# Altium integrated library WE_WR-TBL_Pluggable System_3.81 mm_rev15b.IntLib: 215 symbols (part 1 of 2) (continued)
## 691321300021
designator J?
WR-TBL Terminal block - serie 3213- 3.81 mm; Manufacturer: Würth Elektronik eiSos GmbH; ComponentLink1 Description: Manufacturer; ComponentLink2 Description: Datasheet; NoPins: 21; Created Date: 11 December 2013; partNo: 691321300021; ComponentLink1URL: http://www.we-online.com; ComponentLink2URL: http://katalog.we-online.de/em/datasheet/6913213000xx.pdf; Created by: Karrer Zheng
footprint 691321300021 (3,81mm - PCB Headers - Vertical - 21p)
pins: 1, 2, 3, 4, 5, 6, 7, 8, 9, 10, 11, 12, 13, 14, 15, 16, 17, 18, 19, 20, 21

## 691321300022
designator J?
WR-TBL Terminal block - serie 3213- 3.81 mm; Manufacturer: Würth Elektronik eiSos GmbH; ComponentLink1 Description: Manufacturer; ComponentLink2 Description: Datasheet; NoPins: 22; Created Date: 11 December 2013; partNo: 691321300022; ComponentLink1URL: http://www.we-online.com; ComponentLink2URL: http://katalog.we-online.de/em/datasheet/6913213000xx.pdf; Created by: Karrer Zheng
footprint 691321300022 (3,81mm - PCB Headers - Vertical - 22p)
pins: 1, 2, 3, 4, 5, 6, 7, 8, 9, 10, 11, 12, 13, 14, 15, 16, 17, 18, 19, 20, 21, 22

## 691321300023
designator J?
WR-TBL Terminal block - serie 3213- 3.81 mm; Manufacturer: Würth Elektronik eiSos GmbH; ComponentLink1 Description: Manufacturer; ComponentLink2 Description: Datasheet; NoPins: 23; Created Date: 11 December 2013; partNo: 691321300023; ComponentLink1URL: http://www.we-online.com; ComponentLink2URL: http://katalog.we-online.de/em/datasheet/6913213000xx.pdf; Created by: Karrer Zheng
footprint 691321300023 (3,81mm - PCB Headers - Vertical - 23p)
pins: 1, 2, 3, 4, 5, 6, 7, 8, 9, 10, 11, 12, 13, 14, 15, 16, 17, 18, 19, 20, 21, 22, 23

## 691321300024
designator J?
WR-TBL Terminal block - serie 3213- 3.81 mm; Manufacturer: Würth Elektronik eiSos GmbH; ComponentLink1 Description: Manufacturer; ComponentLink2 Description: Datasheet; NoPins: 24; Created Date: 11 December 2013; partNo: 691321300024; ComponentLink1URL: http://www.we-online.com; ComponentLink2URL: http://katalog.we-online.de/em/datasheet/6913213000xx.pdf; Created by: Karrer Zheng
footprint 691321300024 (3,81mm - PCB Headers - Vertical - 24p)
pins: 1, 2, 3, 4, 5, 6, 7, 8, 9, 10, 11, 12, 13, 14, 15, 16, 17, 18, 19, 20, 21, 22, 23, 24


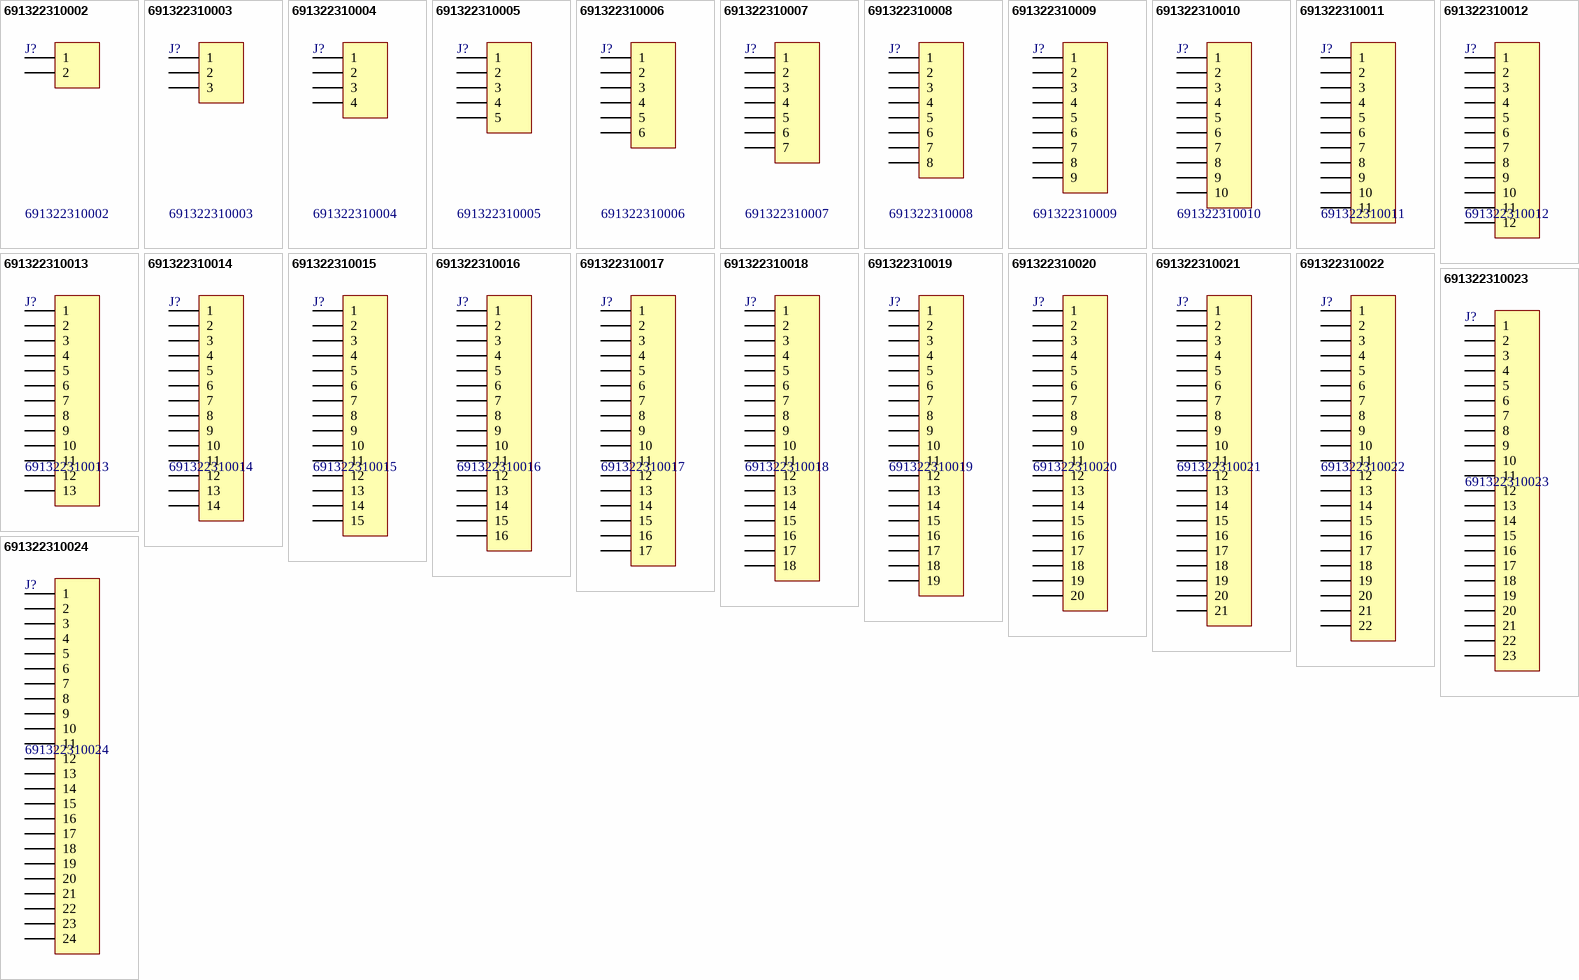
[diagram p5: symbols 691322310002 to 691322310024]

## 691322310002
designator J?
WR-TBL Terminal block - serie 322 - 3.81 mm; Manufacturer: Würth Elektronik eiSos GmbH; ComponentLink1 Description: Manufacturer; ComponentLink2 Description: Datasheet; NoPins: 02; Created Date: 25 December 2013; partNo: 691322310002; ComponentLink1URL: http://www.we-online.com; ComponentLink2URL: http://katalog.we-online.de/em/datasheet/6913223100xx.pdf; Created by: Karrer Zheng
footprint 691322310002 (3,81mm - PCB Headers - Horizontal - 02p)
pins: 1, 2

## 691322310003
designator J?
WR-TBL Terminal block - serie 322 - 3.81 mm; Manufacturer: Würth Elektronik eiSos GmbH; ComponentLink1 Description: Manufacturer; ComponentLink2 Description: Datasheet; NoPins: 03; Created Date: 25 December 2013; partNo: 691322310003; ComponentLink1URL: http://www.we-online.com; ComponentLink2URL: http://katalog.we-online.de/em/datasheet/6913223100xx.pdf; Created by: Karrer Zheng
footprint 691322310003 (3,81mm - PCB Headers - Horizontal - 03p)
pins: 1, 2, 3

## 691322310004
designator J?
WR-TBL Terminal block - serie 322 - 3.81 mm; Manufacturer: Würth Elektronik eiSos GmbH; ComponentLink1 Description: Manufacturer; ComponentLink2 Description: Datasheet; NoPins: 04; Created Date: 25 December 2013; partNo: 691322310004; ComponentLink1URL: http://www.we-online.com; ComponentLink2URL: http://katalog.we-online.de/em/datasheet/6913223100xx.pdf; Created by: Karrer Zheng
footprint 691322310004 (3,81mm - PCB Headers - Horizontal - 04p)
pins: 1, 2, 3, 4

## 691322310005
designator J?
WR-TBL Terminal block - serie 322 - 3.81 mm; Manufacturer: Würth Elektronik eiSos GmbH; ComponentLink1 Description: Manufacturer; ComponentLink2 Description: Datasheet; NoPins: 05; Created Date: 25 December 2013; partNo: 691322310005; ComponentLink1URL: http://www.we-online.com; ComponentLink2URL: http://katalog.we-online.de/em/datasheet/6913223100xx.pdf; Created by: Karrer Zheng
footprint 691322310005 (3,81mm - PCB Headers - Horizontal - 05p)
pins: 1, 2, 3, 4, 5

## 691322310006
designator J?
WR-TBL Terminal block - serie 322 - 3.81 mm; Manufacturer: Würth Elektronik eiSos GmbH; ComponentLink1 Description: Manufacturer; ComponentLink2 Description: Datasheet; NoPins: 06; Created Date: 25 December 2013; partNo: 691322310006; ComponentLink1URL: http://www.we-online.com; ComponentLink2URL: http://katalog.we-online.de/em/datasheet/6913223100xx.pdf; Created by: Karrer Zheng
footprint 691322310006 (3,81mm - PCB Headers - Horizontal - 06p)
pins: 1, 2, 3, 4, 5, 6

## 691322310007
designator J?
WR-TBL Terminal block - serie 322 - 3.81 mm; Manufacturer: Würth Elektronik eiSos GmbH; ComponentLink1 Description: Manufacturer; ComponentLink2 Description: Datasheet; NoPins: 07; Created Date: 25 December 2013; partNo: 691322310007; ComponentLink1URL: http://www.we-online.com; ComponentLink2URL: http://katalog.we-online.de/em/datasheet/6913223100xx.pdf; Created by: Karrer Zheng
footprint 691322310007 (3,81mm - PCB Headers - Horizontal - 07p)
pins: 1, 2, 3, 4, 5, 6, 7

## 691322310008
designator J?
WR-TBL Terminal block - serie 322 - 3.81 mm; Manufacturer: Würth Elektronik eiSos GmbH; ComponentLink1 Description: Manufacturer; ComponentLink2 Description: Datasheet; NoPins: 08; Created Date: 25 December 2013; partNo: 691322310008; ComponentLink1URL: http://www.we-online.com; ComponentLink2URL: http://katalog.we-online.de/em/datasheet/6913223100xx.pdf; Created by: Karrer Zheng
footprint 691322310008 (3,81mm - PCB Headers - Horizontal - 08p)
pins: 1, 2, 3, 4, 5, 6, 7, 8

## 691322310009
designator J?
WR-TBL Terminal block - serie 322 - 3.81 mm; Manufacturer: Würth Elektronik eiSos GmbH; ComponentLink1 Description: Manufacturer; ComponentLink2 Description: Datasheet; NoPins: 09; Created Date: 25 December 2013; partNo: 691322310009; ComponentLink1URL: http://www.we-online.com; ComponentLink2URL: http://katalog.we-online.de/em/datasheet/6913223100xx.pdf; Created by: Karrer Zheng
footprint 691322310009 (3,81mm - PCB Headers - Horizontal - 09p)
pins: 1, 2, 3, 4, 5, 6, 7, 8, 9

## 691322310010
designator J?
WR-TBL Terminal block - serie 322 - 3.81 mm; Manufacturer: Würth Elektronik eiSos GmbH; ComponentLink1 Description: Manufacturer; ComponentLink2 Description: Datasheet; NoPins: 10; Created Date: 25 December 2013; partNo: 691322310010; ComponentLink1URL: http://www.we-online.com; ComponentLink2URL: http://katalog.we-online.de/em/datasheet/6913223100xx.pdf; Created by: Karrer Zheng
footprint 691322310010 (3,81mm - PCB Headers - Horizontal - 10p)
pins: 1, 2, 3, 4, 5, 6, 7, 8, 9, 10

## 691322310011
designator J?
WR-TBL Terminal block - serie 322 - 3.81 mm; Manufacturer: Würth Elektronik eiSos GmbH; ComponentLink1 Description: Manufacturer; ComponentLink2 Description: Datasheet; NoPins: 11; Created Date: 25 December 2013; partNo: 691322310011; ComponentLink1URL: http://www.we-online.com; ComponentLink2URL: http://katalog.we-online.de/em/datasheet/6913223100xx.pdf; Created by: Karrer Zheng
footprint 691322310011 (3,81mm - PCB Headers - Horizontal - 11p)
pins: 1, 2, 3, 4, 5, 6, 7, 8, 9, 10, 11

## 691322310012
designator J?
WR-TBL Terminal block - serie 322 - 3.81 mm; Manufacturer: Würth Elektronik eiSos GmbH; ComponentLink1 Description: Manufacturer; ComponentLink2 Description: Datasheet; NoPins: 12; Created Date: 25 December 2013; partNo: 691322310012; ComponentLink1URL: http://www.we-online.com; ComponentLink2URL: http://katalog.we-online.de/em/datasheet/6913223100xx.pdf; Created by: Karrer Zheng
footprint 691322310012 (3,81mm - PCB Headers - Horizontal - 12p)
pins: 1, 2, 3, 4, 5, 6, 7, 8, 9, 10, 11, 12

## 691322310013
designator J?
WR-TBL Terminal block - serie 322 - 3.81 mm; Manufacturer: Würth Elektronik eiSos GmbH; ComponentLink1 Description: Manufacturer; ComponentLink2 Description: Datasheet; NoPins: 13; Created Date: 25 December 2013; partNo: 691322310013; ComponentLink1URL: http://www.we-online.com; ComponentLink2URL: http://katalog.we-online.de/em/datasheet/6913223100xx.pdf; Created by: Karrer Zheng
footprint 691322310013 (3,81mm - PCB Headers - Horizontal - 13p)
pins: 1, 2, 3, 4, 5, 6, 7, 8, 9, 10, 11, 12, 13

## 691322310014
designator J?
WR-TBL Terminal block - serie 322 - 3.81 mm; Manufacturer: Würth Elektronik eiSos GmbH; ComponentLink1 Description: Manufacturer; ComponentLink2 Description: Datasheet; NoPins: 14; Created Date: 25 December 2013; partNo: 691322310014; ComponentLink1URL: http://www.we-online.com; ComponentLink2URL: http://katalog.we-online.de/em/datasheet/6913223100xx.pdf; Created by: Karrer Zheng
footprint 691322310014 (3,81mm - PCB Headers - Horizontal - 14p)
pins: 1, 2, 3, 4, 5, 6, 7, 8, 9, 10, 11, 12, 13, 14

## 691322310015
designator J?
WR-TBL Terminal block - serie 322 - 3.81 mm; Manufacturer: Würth Elektronik eiSos GmbH; ComponentLink1 Description: Manufacturer; ComponentLink2 Description: Datasheet; NoPins: 15; Created Date: 25 December 2013; partNo: 691322310015; ComponentLink1URL: http://www.we-online.com; ComponentLink2URL: http://katalog.we-online.de/em/datasheet/6913223100xx.pdf; Created by: Karrer Zheng
footprint 691322310015 (3,81mm - PCB Headers - Horizontal - 15p)
pins: 1, 2, 3, 4, 5, 6, 7, 8, 9, 10, 11, 12, 13, 14, 15

## 691322310016
designator J?
WR-TBL Terminal block - serie 322 - 3.81 mm; Manufacturer: Würth Elektronik eiSos GmbH; ComponentLink1 Description: Manufacturer; ComponentLink2 Description: Datasheet; NoPins: 16; Created Date: 25 December 2013; partNo: 691322310016; ComponentLink1URL: http://www.we-online.com; ComponentLink2URL: http://katalog.we-online.de/em/datasheet/6913223100xx.pdf; Created by: Karrer Zheng
footprint 691322310016 (3,81mm - PCB Headers - Horizontal - 16p)
pins: 1, 2, 3, 4, 5, 6, 7, 8, 9, 10, 11, 12, 13, 14, 15, 16

## 691322310017
designator J?
WR-TBL Terminal block - serie 322 - 3.81 mm; Manufacturer: Würth Elektronik eiSos GmbH; ComponentLink1 Description: Manufacturer; ComponentLink2 Description: Datasheet; NoPins: 17; Created Date: 25 December 2013; partNo: 691322310017; ComponentLink1URL: http://www.we-online.com; ComponentLink2URL: http://katalog.we-online.de/em/datasheet/6913223100xx.pdf; Created by: Karrer Zheng
footprint 691322310017 (3,81mm - PCB Headers - Horizontal - 17p)
pins: 1, 2, 3, 4, 5, 6, 7, 8, 9, 10, 11, 12, 13, 14, 15, 16, 17

## 691322310018
designator J?
WR-TBL Terminal block - serie 322 - 3.81 mm; Manufacturer: Würth Elektronik eiSos GmbH; ComponentLink1 Description: Manufacturer; ComponentLink2 Description: Datasheet; NoPins: 18; Created Date: 25 December 2013; partNo: 691322310018; ComponentLink1URL: http://www.we-online.com; ComponentLink2URL: http://katalog.we-online.de/em/datasheet/6913223100xx.pdf; Created by: Karrer Zheng
footprint 691322310018 (3,81mm - PCB Headers - Horizontal -18p)
pins: 1, 2, 3, 4, 5, 6, 7, 8, 9, 10, 11, 12, 13, 14, 15, 16, 17, 18

## 691322310019
designator J?
WR-TBL Terminal block - serie 322 - 3.81 mm; Manufacturer: Würth Elektronik eiSos GmbH; ComponentLink1 Description: Manufacturer; ComponentLink2 Description: Datasheet; NoPins: 19; Created Date: 25 December 2013; partNo: 691322310019; ComponentLink1URL: http://www.we-online.com; ComponentLink2URL: http://katalog.we-online.de/em/datasheet/6913223100xx.pdf; Created by: Karrer Zheng
footprint 691322310019 (3,81mm - PCB Headers - Horizontal - 19p)
pins: 1, 2, 3, 4, 5, 6, 7, 8, 9, 10, 11, 12, 13, 14, 15, 16, 17, 18, 19

## 691322310020
designator J?
WR-TBL Terminal block - serie 322 - 3.81 mm; Manufacturer: Würth Elektronik eiSos GmbH; ComponentLink1 Description: Manufacturer; ComponentLink2 Description: Datasheet; NoPins: 20; Created Date: 25 December 2013; partNo: 691322310020; ComponentLink1URL: http://www.we-online.com; ComponentLink2URL: http://katalog.we-online.de/em/datasheet/6913223100xx.pdf; Created by: Karrer Zheng
footprint 691322310020 (3,81mm - PCB Headers - Horizontal - 20p)
pins: 1, 2, 3, 4, 5, 6, 7, 8, 9, 10, 11, 12, 13, 14, 15, 16, 17, 18, 19, 20

## 691322310021
designator J?
WR-TBL Terminal block - serie 322 - 3.81 mm; Manufacturer: Würth Elektronik eiSos GmbH; ComponentLink1 Description: Manufacturer; ComponentLink2 Description: Datasheet; NoPins: 21; Created Date: 25 December 2013; partNo: 691322310021; ComponentLink1URL: http://www.we-online.com; ComponentLink2URL: http://katalog.we-online.de/em/datasheet/6913223100xx.pdf; Created by: Karrer Zheng
footprint 691322310021 (3,81mm - PCB Headers - Horizontal - 21p)
pins: 1, 2, 3, 4, 5, 6, 7, 8, 9, 10, 11, 12, 13, 14, 15, 16, 17, 18, 19, 20, 21

## 691322310022
designator J?
WR-TBL Terminal block - serie 322 - 3.81 mm; Manufacturer: Würth Elektronik eiSos GmbH; ComponentLink1 Description: Manufacturer; ComponentLink2 Description: Datasheet; NoPins: 22; Created Date: 25 December 2013; partNo: 691322310022; ComponentLink1URL: http://www.we-online.com; ComponentLink2URL: http://katalog.we-online.de/em/datasheet/6913223100xx.pdf; Created by: Karrer Zheng
footprint 691322310022 (3,81mm - PCB Headers - Horizontal - 22p)
pins: 1, 2, 3, 4, 5, 6, 7, 8, 9, 10, 11, 12, 13, 14, 15, 16, 17, 18, 19, 20, 21, 22

## 691322310023
designator J?
WR-TBL Terminal block - serie 322 - 3.81 mm; Manufacturer: Würth Elektronik eiSos GmbH; ComponentLink1 Description: Manufacturer; ComponentLink2 Description: Datasheet; NoPins: 23; Created Date: 25 December 2013; partNo: 691322310023; ComponentLink1URL: http://www.we-online.com; ComponentLink2URL: http://katalog.we-online.de/em/datasheet/6913223100xx.pdf; Created by: Karrer Zheng
footprint 691322310023 (3,81mm - PCB Headers - Horizontal - 23p)
pins: 1, 2, 3, 4, 5, 6, 7, 8, 9, 10, 11, 12, 13, 14, 15, 16, 17, 18, 19, 20, 21, 22, 23

## 691322310024
designator J?
WR-TBL Terminal block - serie 322 - 3.81 mm; Manufacturer: Würth Elektronik eiSos GmbH; ComponentLink1 Description: Manufacturer; ComponentLink2 Description: Datasheet; NoPins: 24; Created Date: 25 December 2013; partNo: 691322310024; ComponentLink1URL: http://www.we-online.com; ComponentLink2URL: http://katalog.we-online.de/em/datasheet/6913223100xx.pdf; Created by: Karrer Zheng
footprint 691322310024 (3,81mm - PCB Headers - Horizontal - 24p)
pins: 1, 2, 3, 4, 5, 6, 7, 8, 9, 10, 11, 12, 13, 14, 15, 16, 17, 18, 19, 20, 21, 22, 23, 24


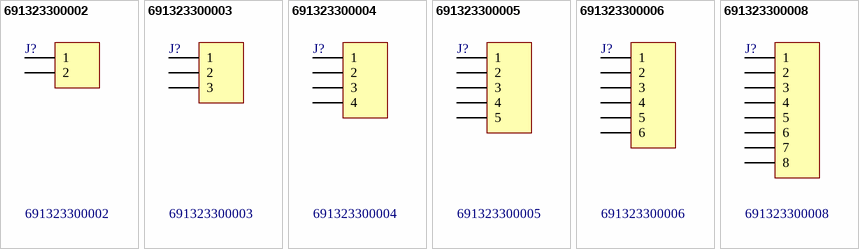
[diagram p6: symbols 691323300002 to 691323300008]

## 691323300002
designator J?
WR-TBL Terminal block - serie 3233 - 3.81 mm; Manufacturer: Würth Elektronik eiSos GmbH; ComponentLink1 Description: Manufacturer; ComponentLink2 Description: Datasheet; NoPins: 2; Created Date: 13 December 2013; partNo: 691323300002; ComponentLink1URL: http://www.we-online.com; ComponentLink2URL: http://katalog.we-online.de/em/datasheet/6913233000xx.pdf; Created by: Karrer Zheng
footprint 691323300002
pins: 1, 2

## 691323300003
designator J?
WR-TBL Terminal block - serie 3233 - 3.81 mm; Manufacturer: Würth Elektronik eiSos GmbH; ComponentLink1 Description: Manufacturer; ComponentLink2 Description: Datasheet; NoPins: 3; Created Date: 13 December 2013; partNo: 691323300003; ComponentLink1URL: http://www.we-online.com; ComponentLink2URL: http://katalog.we-online.de/em/datasheet/6913233000xx.pdf; Created by: Karrer Zheng
footprint 691323300003
pins: 1, 2, 3

## 691323300004
designator J?
WR-TBL Terminal block - serie 3233 - 3.81 mm; Manufacturer: Würth Elektronik eiSos GmbH; ComponentLink1 Description: Manufacturer; ComponentLink2 Description: Datasheet; NoPins: 4; Created Date: 13 December 2013; partNo: 691323300004; ComponentLink1URL: http://www.we-online.com; ComponentLink2URL: http://katalog.we-online.de/em/datasheet/6913233000xx.pdf; Created by: Karrer Zheng
footprint 691323300004
pins: 1, 2, 3, 4

## 691323300005
designator J?
WR-TBL Terminal block - serie 3233 - 3.81 mm; Manufacturer: Würth Elektronik eiSos GmbH; ComponentLink1 Description: Manufacturer; ComponentLink2 Description: Datasheet; NoPins: 5; Created Date: 13 December 2013; partNo: 691323300005; ComponentLink1URL: http://www.we-online.com; ComponentLink2URL: http://katalog.we-online.de/em/datasheet/6913233000xx.pdf; Created by: Karrer Zheng
footprint 691323300005
pins: 1, 2, 3, 4, 5

## 691323300006
designator J?
WR-TBL Terminal block - serie 3233 - 3.81 mm; Manufacturer: Würth Elektronik eiSos GmbH; ComponentLink1 Description: Manufacturer; ComponentLink2 Description: Datasheet; NoPins: 6; Created Date: 13 December 2013; partNo: 691323300006; ComponentLink1URL: http://www.we-online.com; ComponentLink2URL: http://katalog.we-online.de/em/datasheet/6913233000xx.pdf; Created by: Karrer Zheng
footprint 691323300006
pins: 1, 2, 3, 4, 5, 6

## 691323300008
designator J?
WR-TBL Terminal block - serie 3233 - 3.81 mm; Manufacturer: Würth Elektronik eiSos GmbH; ComponentLink1 Description: Manufacturer; ComponentLink2 Description: Datasheet; NoPins: 8; Created Date: 13 December 2013; partNo: 691323300008; ComponentLink1URL: http://www.we-online.com; ComponentLink2URL: http://katalog.we-online.de/em/datasheet/6913233000xx.pdf; Created by: Karrer Zheng
footprint 691323300008
pins: 1, 2, 3, 4, 5, 6, 7, 8


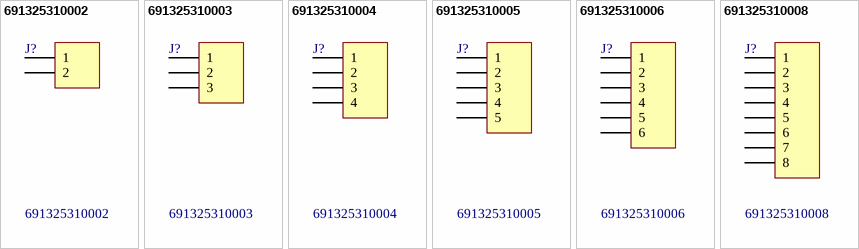
[diagram p7: symbols 691325310002 to 691325310008]

## 691325310002
designator J?
WR-TBL Terminal block - serie 3253- 3.81 mm; Manufacturer: Würth Elektronik eiSos GmbH; ComponentLink1 Description: Manufacturer; ComponentLink2 Description: Datasheet; NoPins: 02; Created Date: 25 December 2013; partNo: 691325310002; ComponentLink1URL: http://www.we-online.com; ComponentLink2URL: http://katalog.we-online.de/em/datasheet/6913253100xx.pdf; Created by: Karrer Zheng
footprint 691325310002 (3,81mm - PCB  Horizontal With Flanges - 02p)
pins: 1, 2

## 691325310003
designator J?
WR-TBL Terminal block - serie 3253- 3.81 mm; Manufacturer: Würth Elektronik eiSos GmbH; ComponentLink1 Description: Manufacturer; ComponentLink2 Description: Datasheet; NoPins: 03; Created Date: 25 December 2013; partNo: 691325310003; ComponentLink1URL: http://www.we-online.com; ComponentLink2URL: http://katalog.we-online.de/em/datasheet/6913253100xx.pdf; Created by: Karrer Zheng
footprint 691325310003 (3,81mm - PCB  Horizontal With Flanges - 03p)
pins: 1, 2, 3

## 691325310004
designator J?
WR-TBL Terminal block - serie 3253- 3.81 mm; Manufacturer: Würth Elektronik eiSos GmbH; ComponentLink1 Description: Manufacturer; ComponentLink2 Description: Datasheet; NoPins: 04; Created Date: 25 December 2013; partNo: 691325310004; ComponentLink1URL: http://www.we-online.com; ComponentLink2URL: http://katalog.we-online.de/em/datasheet/6913253100xx.pdf; Created by: Karrer Zheng
footprint 691325310004 (3,81mm - PCB  Horizontal With Flanges - 04p)
pins: 1, 2, 3, 4

## 691325310005
designator J?
WR-TBL Terminal block - serie 3253- 3.81 mm; Manufacturer: Würth Elektronik eiSos GmbH; ComponentLink1 Description: Manufacturer; ComponentLink2 Description: Datasheet; NoPins: 05; Created Date: 25 December 2013; partNo: 691325310005; ComponentLink1URL: http://www.we-online.com; ComponentLink2URL: http://katalog.we-online.de/em/datasheet/6913253100xx.pdf; Created by: Karrer Zheng
footprint 691325310005 (3,81mm - PCB  Horizontal With Flanges - 05p)
pins: 1, 2, 3, 4, 5

## 691325310006
designator J?
WR-TBL Terminal block - serie 3253- 3.81 mm; Manufacturer: Würth Elektronik eiSos GmbH; ComponentLink1 Description: Manufacturer; ComponentLink2 Description: Datasheet; NoPins: 06; Created Date: 25 December 2013; partNo: 691325310006; ComponentLink1URL: http://www.we-online.com; ComponentLink2URL: http://katalog.we-online.de/em/datasheet/6913253100xx.pdf; Created by: Karrer Zheng
footprint 691325310006 (3,81mm - PCB  Horizontal With Flanges - 06p)
pins: 1, 2, 3, 4, 5, 6

## 691325310008
designator J?
WR-TBL Terminal block - serie 3253- 3.81 mm; Manufacturer: Würth Elektronik eiSos GmbH; ComponentLink1 Description: Manufacturer; ComponentLink2 Description: Datasheet; NoPins: 08; Created Date: 25 December 2013; partNo: 691325310008; ComponentLink1URL: http://www.we-online.com; ComponentLink2URL: http://katalog.we-online.de/em/datasheet/6913253100xx.pdf; Created by: Karrer Zheng
footprint 691325310008 (3,81mm - PCB  Horizontal With Flanges - 08p)
pins: 1, 2, 3, 4, 5, 6, 7, 8


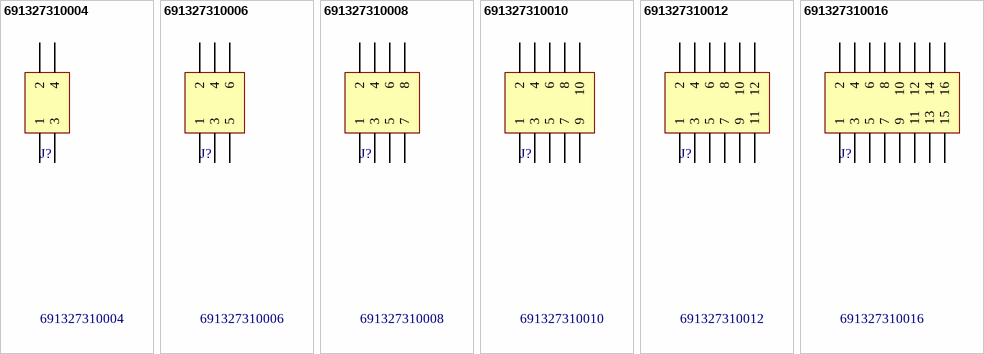
[diagram p8: symbols 691327310004 to 691327310016]

## 691327310004
designator J?
WR-TBL Terminal block - serie 3273 - 3.81 mm; Manufacturer: Würth Elektronik eiSos GmbH; ComponentLink1 Description: Manufacturer; ComponentLink2 Description: Datasheet; NoPins: 04; Created Date: 25 December 2013; partNo: 691327310004; ComponentLink1URL: http://www.we-online.com; ComponentLink2URL: http://katalog.we-online.de/em/datasheet/6913273100xx.pdf; Created by: Karrer Zheng
footprint 691327310004 (3,81mm - PCB - Dual row - Horizontal - 04p)
pins: 1, 2, 3, 4

## 691327310006
designator J?
WR-TBL Terminal block - serie 3273 - 3.81 mm; Manufacturer: Würth Elektronik eiSos GmbH; ComponentLink1 Description: Manufacturer; ComponentLink2 Description: Datasheet; NoPins: 6; Created Date: 25 December 2013; partNo: 691327310006; ComponentLink1URL: http://www.we-online.com; ComponentLink2URL: http://katalog.we-online.de/em/datasheet/6913273100xx.pdf; Created by: Karrer Zheng
footprint 691327310006 (3,81mm - PCB - Dual row - Horizontal - 06p)
pins: 1, 2, 3, 4, 5, 6

## 691327310008
designator J?
WR-TBL Terminal block - serie 3273 - 3.81 mm; Manufacturer: Würth Elektronik eiSos GmbH; ComponentLink1 Description: Manufacturer; ComponentLink2 Description: Datasheet; NoPins: 08; Created Date: 25 December 2013; partNo: 691327310008; ComponentLink1URL: http://www.we-online.com; ComponentLink2URL: http://katalog.we-online.de/em/datasheet/6913273100xx.pdf; Created by: Karrer Zheng
footprint 691327310008 (3,81mm - PCB - Dual row - Horizontal - 08p)
pins: 1, 2, 3, 4, 5, 6, 7, 8

## 691327310010
designator J?
WR-TBL Terminal block - serie 3273 - 3.81 mm; Manufacturer: Würth Elektronik eiSos GmbH; ComponentLink1 Description: Manufacturer; ComponentLink2 Description: Datasheet; NoPins: 10; Created Date: 25 December 2013; partNo: 691327310010; ComponentLink1URL: http://www.we-online.com; ComponentLink2URL: http://katalog.we-online.de/em/datasheet/6913273100xx.pdf; Created by: Karrer Zheng
footprint 691327310010 (3,81mm - PCB - Dual row - Horizontal - 10p)
pins: 1, 2, 3, 4, 5, 6, 7, 8, 9, 10

## 691327310012
designator J?
WR-TBL Terminal block - serie 3273 - 3.81 mm; Manufacturer: Würth Elektronik eiSos GmbH; ComponentLink1 Description: Manufacturer; ComponentLink2 Description: Datasheet; NoPins: 12; Created Date: 25 December 2013; partNo: 691327310012; ComponentLink1URL: http://www.we-online.com; ComponentLink2URL: http://katalog.we-online.de/em/datasheet/6913273100xx.pdf; Created by: Karrer Zheng
footprint 691327310012 (3,81mm - PCB - Dual row - Horizontal - 12p)
pins: 1, 2, 3, 4, 5, 6, 7, 8, 9, 10, 11, 12

## 691327310016
designator J?
WR-TBL Terminal block - serie 3273 - 3.81 mm; Manufacturer: Würth Elektronik eiSos GmbH; ComponentLink1 Description: Manufacturer; ComponentLink2 Description: Datasheet; NoPins: 16; Created Date: 25 December 2013; partNo: 691327310016; ComponentLink1URL: http://www.we-online.com; ComponentLink2URL: http://katalog.we-online.de/em/datasheet/6913273100xx.pdf; Created by: Karrer Zheng
footprint 691327310016 (3,81mm - PCB - Dual row - Horizontal - 16p)
pins: 1, 2, 3, 4, 5, 6, 7, 8, 9, 10, 11, 12, 13, 14, 15, 16


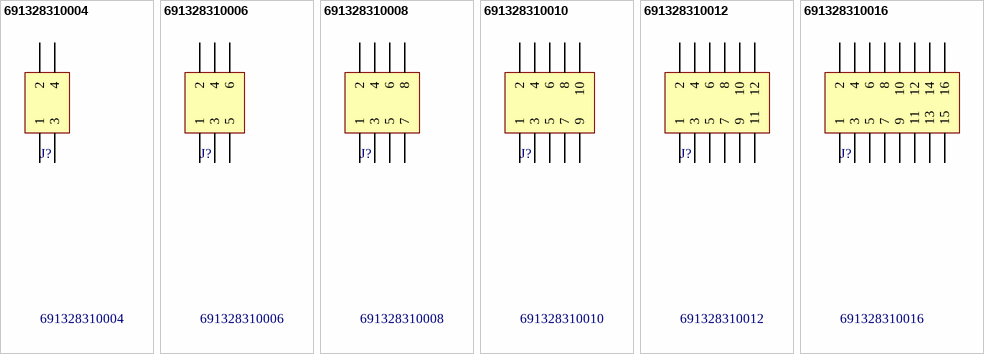
[diagram p9: symbols 691328310004 to 691328310016]

## 691328310004
designator J?
WR-TBL Terminal block - serie 3283 - 3.81 mm; Manufacturer: Würth Elektronik eiSos GmbH; ComponentLink1 Description: Manufacturer; ComponentLink2 Description: Datasheet; NoPins: 04; Created Date: 27 December 2013; partNo: 691328310004; ComponentLink1URL: http://www.we-online.com; ComponentLink2URL: http://katalog.we-online.de/em/datasheet/6913283100xx.pdf; Created by: Karrer Zheng
footprint 691328310004 (3,81mm - PCB - Dual row - Horizontal - Flanges - 04p)
pins: 1, 2, 3, 4

## 691328310006
designator J?
WR-TBL Terminal block - serie 3283 - 3.81 mm; Manufacturer: Würth Elektronik eiSos GmbH; ComponentLink1 Description: Manufacturer; ComponentLink2 Description: Datasheet; NoPins: 06; Created Date: 27 December 2013; partNo: 691328310006; ComponentLink1URL: http://www.we-online.com; ComponentLink2URL: http://katalog.we-online.de/em/datasheet/6913283100xx.pdf; Created by: Karrer Zheng
footprint 691328310006 (3,81mm - PCB - Dual row - Horizontal - Flanges - 06p)
pins: 1, 2, 3, 4, 5, 6

## 691328310008
designator J?
WR-TBL Terminal block - serie 3283 - 3.81 mm; Manufacturer: Würth Elektronik eiSos GmbH; ComponentLink1 Description: Manufacturer; ComponentLink2 Description: Datasheet; NoPins: 08; Created Date: 27 December 2013; partNo: 691328310008; ComponentLink1URL: http://www.we-online.com; ComponentLink2URL: http://katalog.we-online.de/em/datasheet/6913283100xx.pdf; Created by: Karrer Zheng
footprint 691328310008 (3,81mm - PCB - Dual row - Horizontal - Flanges - 08p)
pins: 1, 2, 3, 4, 5, 6, 7, 8

## 691328310010
designator J?
WR-TBL Terminal block - serie 3283 - 3.81 mm; Manufacturer: Würth Elektronik eiSos GmbH; ComponentLink1 Description: Manufacturer; ComponentLink2 Description: Datasheet; NoPins: 10; Created Date: 27 December 2013; partNo: 691328310010; ComponentLink1URL: http://www.we-online.com; ComponentLink2URL: http://katalog.we-online.de/em/datasheet/6913283100xx.pdf; Created by: Karrer Zheng
footprint 691328310010 (3,81mm - PCB - Dual row - Horizontal - Flanges - 10p)
pins: 1, 2, 3, 4, 5, 6, 7, 8, 9, 10

## 691328310012
designator J?
WR-TBL Terminal block - serie 3283 - 3.81 mm; Manufacturer: Würth Elektronik eiSos GmbH; ComponentLink1 Description: Manufacturer; ComponentLink2 Description: Datasheet; NoPins: 12; Created Date: 27 December 2013; partNo: 691328310012; ComponentLink1URL: http://www.we-online.com; ComponentLink2URL: http://katalog.we-online.de/em/datasheet/6913283100xx.pdf; Created by: Karrer Zheng
footprint 691328310012 (3,81mm - PCB - Dual row - Horizontal - Flanges - 12p)
pins: 1, 2, 3, 4, 5, 6, 7, 8, 9, 10, 11, 12

## 691328310016
designator J?
WR-TBL Terminal block - serie 3283 - 3.81 mm; Manufacturer: Würth Elektronik eiSos GmbH; ComponentLink1 Description: Manufacturer; ComponentLink2 Description: Datasheet; NoPins: 16; Created Date: 27 December 2013; partNo: 691328310016; ComponentLink1URL: http://www.we-online.com; ComponentLink2URL: http://katalog.we-online.de/em/datasheet/6913283100xx.pdf; Created by: Karrer Zheng
footprint 691328310016 (3,81mm - PCB - Dual row - Horizontal - Flanges - 16p)
pins: 1, 2, 3, 4, 5, 6, 7, 8, 9, 10, 11, 12, 13, 14, 15, 16


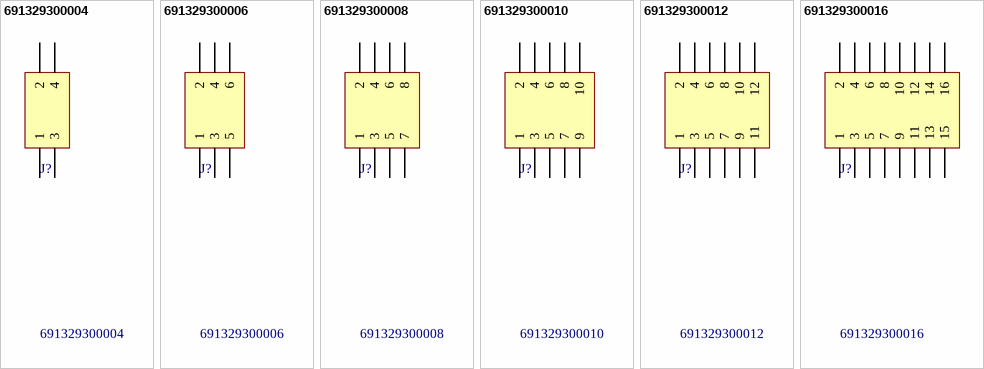
[diagram p10: symbols 691329300004 to 691329300016]

## 691329300004
designator J?
WR-TBL Terminal block - serie 3293 - 3.81 mm; Manufacturer: Würth Elektronik eiSos GmbH; ComponentLink1 Description: Manufacturer; ComponentLink2 Description: Datasheet; NoPins: 4; Created Date: 13 December 2013; partNo: 691329300004; ComponentLink1URL: http://www.we-online.com; ComponentLink2URL: http://katalog.we-online.de/em/datasheet/6913293000xxB.pdf; Created by: Karrer Zheng
footprint 691329300004 (3,81mm - PCB - Dual row - Vertical - 04p)
pins: 1, 2, 3, 4

## 691329300006
designator J?
WR-TBL Terminal block - serie 3293 - 3.81 mm; Manufacturer: Würth Elektronik eiSos GmbH; ComponentLink1 Description: Manufacturer; ComponentLink2 Description: Datasheet; NoPins: 6; Created Date: 13 December 2013; partNo: 691329300006; ComponentLink1URL: http://www.we-online.com; ComponentLink2URL: http://katalog.we-online.de/em/datasheet/6913293000xxB.pdf; Created by: Karrer Zheng
footprint 691329300006 (3,81mm - PCB - Dual row - Vertical - 06p)
pins: 1, 2, 3, 4, 5, 6

## 691329300008
designator J?
WR-TBL Terminal block - serie 3293 - 3.81 mm; Manufacturer: Würth Elektronik eiSos GmbH; ComponentLink1 Description: Manufacturer; ComponentLink2 Description: Datasheet; NoPins: 8; Created Date: 13 December 2013; partNo: 691329300008; ComponentLink1URL: http://www.we-online.com; ComponentLink2URL: http://katalog.we-online.de/em/datasheet/6913293000xxB.pdf; Created by: Karrer Zheng
footprint 691329300008 (3,81mm - PCB - Dual row - Vertical - 08p)
pins: 1, 2, 3, 4, 5, 6, 7, 8

## 691329300010
designator J?
WR-TBL Terminal block - serie 3293 - 3.81 mm; Manufacturer: Würth Elektronik eiSos GmbH; ComponentLink1 Description: Manufacturer; ComponentLink2 Description: Datasheet; NoPins: 10; Created Date: 13 December 2013; partNo: 691329300010; ComponentLink1URL: http://www.we-online.com; ComponentLink2URL: http://katalog.we-online.de/em/datasheet/6913293000xxB.pdf; Created by: Karrer Zheng
footprint 691329300010 (3,81mm - PCB - Dual row - Vertical - 10p)
pins: 1, 2, 3, 4, 5, 6, 7, 8, 9, 10

## 691329300012
designator J?
WR-TBL Terminal block - serie 3293 - 3.81 mm; Manufacturer: Würth Elektronik eiSos GmbH; ComponentLink1 Description: Manufacturer; ComponentLink2 Description: Datasheet; NoPins: 12; Created Date: 13 December 2013; partNo: 691329300012; ComponentLink1URL: http://www.we-online.com; ComponentLink2URL: http://katalog.we-online.de/em/datasheet/6913293000xxB.pdf; Created by: Karrer Zheng
footprint 691329300012 (3,81mm - PCB - Dual row - Vertical - 12p)
pins: 1, 2, 3, 4, 5, 6, 7, 8, 9, 10, 11, 12

## 691329300016
designator J?
WR-TBL Terminal block - serie 3293 - 3.81 mm; Manufacturer: Würth Elektronik eiSos GmbH; ComponentLink1 Description: Manufacturer; ComponentLink2 Description: Datasheet; NoPins: 16; Created Date: 13 December 2013; partNo: 691329300016; ComponentLink1URL: http://www.we-online.com; ComponentLink2URL: http://katalog.we-online.de/em/datasheet/6913293000xxB.pdf; Created by: Karrer Zheng
footprint 691329300016 (3,81mm - PCB - Dual row - Vertical - 16p)
pins: 1, 2, 3, 4, 5, 6, 7, 8, 9, 10, 11, 12, 13, 14, 15, 16


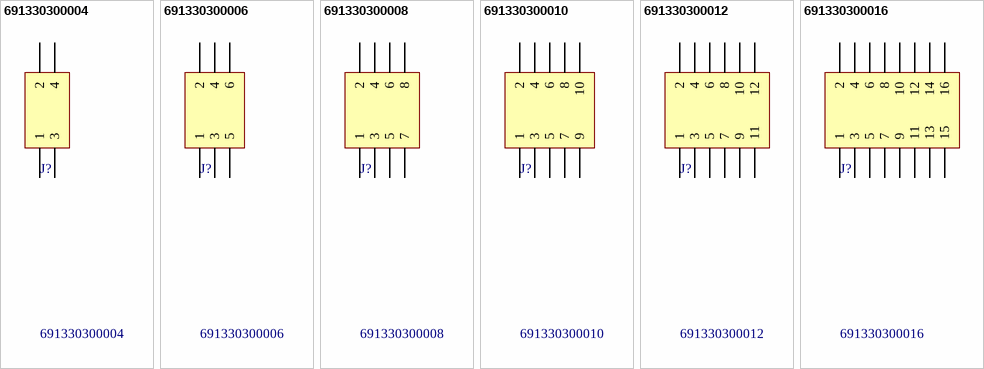
[diagram p11: symbols 691330300004 to 691330300016]

## 691330300004
designator J?
WR-TBL Terminal block - serie 3303 - 3.81 mm; Manufacturer: Würth Elektronik eiSos GmbH; ComponentLink1 Description: Manufacturer; ComponentLink2 Description: Datasheet; NoPins: 4; Created Date: 23 December 2013; partNo: 691330300004; ComponentLink1URL: http://www.we-online.com; ComponentLink2URL: http://katalog.we-online.de/em/datasheet/6913303000xx.pdf; Created by: Karrer Zheng
footprint 691330300004 (3,81mm - PCB - Dual row - Vertical - Flanges - 04p)
pins: 1, 2, 3, 4

## 691330300006
designator J?
WR-TBL Terminal block - serie 3303 - 3.81 mm; Manufacturer: Würth Elektronik eiSos GmbH; ComponentLink1 Description: Manufacturer; ComponentLink2 Description: Datasheet; NoPins: 6; Created Date: 23 December 2013; partNo: 691330300006; ComponentLink1URL: http://www.we-online.com; ComponentLink2URL: http://katalog.we-online.de/em/datasheet/6913303000xx.pdf; Created by: Karrer Zheng
footprint 691330300006 (3,81mm - PCB - Dual row - Vertical - Flanges - 06p)
pins: 1, 2, 3, 4, 5, 6

## 691330300008
designator J?
WR-TBL Terminal block - serie 3303 - 3.81 mm; Manufacturer: Würth Elektronik eiSos GmbH; ComponentLink1 Description: Manufacturer; ComponentLink2 Description: Datasheet; NoPins: 8; Created Date: 23 December 2013; partNo: 691330300008; ComponentLink1URL: http://www.we-online.com; ComponentLink2URL: http://katalog.we-online.de/em/datasheet/6913303000xx.pdf; Created by: Karrer Zheng
footprint 691330300008 (3,81mm - PCB - Dual row - Vertical - Flanges - 08p)
pins: 1, 2, 3, 4, 5, 6, 7, 8

## 691330300010
designator J?
WR-TBL Terminal block - serie 3303 - 3.81 mm; Manufacturer: Würth Elektronik eiSos GmbH; ComponentLink1 Description: Manufacturer; ComponentLink2 Description: Datasheet; NoPins: 10; Created Date: 23 December 2013; partNo: 691330300010; ComponentLink1URL: http://www.we-online.com; ComponentLink2URL: http://katalog.we-online.de/em/datasheet/6913303000xx.pdf; Created by: Karrer Zheng
footprint 691330300010 (3,81mm - PCB - Dual row - Vertical - Flanges - 10p)
pins: 1, 2, 3, 4, 5, 6, 7, 8, 9, 10

## 691330300012
designator J?
WR-TBL Terminal block - serie 3303 - 3.81 mm; Manufacturer: Würth Elektronik eiSos GmbH; ComponentLink1 Description: Manufacturer; ComponentLink2 Description: Datasheet; NoPins: 12; Created Date: 23 December 2013; partNo: 691330300012; ComponentLink1URL: http://www.we-online.com; ComponentLink2URL: http://katalog.we-online.de/em/datasheet/6913303000xx.pdf; Created by: Karrer Zheng
footprint 691330300012 (3,81mm - PCB - Dual row - Vertical - Flanges - 12p)
pins: 1, 2, 3, 4, 5, 6, 7, 8, 9, 10, 11, 12

## 691330300016
designator J?
WR-TBL Terminal block - serie 3303 - 3.81 mm; Manufacturer: Würth Elektronik eiSos GmbH; ComponentLink1 Description: Manufacturer; ComponentLink2 Description: Datasheet; NoPins: 16; Created Date: 23 December 2013; partNo: 691330300016; ComponentLink1URL: http://www.we-online.com; ComponentLink2URL: http://katalog.we-online.de/em/datasheet/6913303000xx.pdf; Created by: Karrer Zheng
footprint 691330300016 (3,81mm - PCB - Dual row - Vertical - Flanges - 16p)
pins: 1, 2, 3, 4, 5, 6, 7, 8, 9, 10, 11, 12, 13, 14, 15, 16


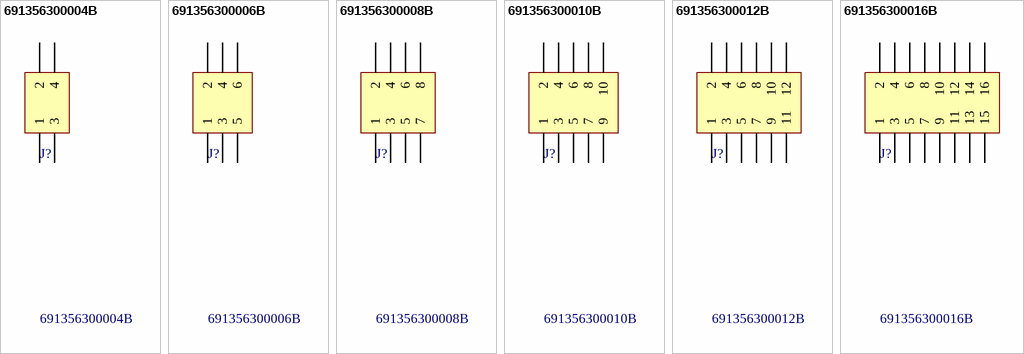
[diagram p12: symbols 691356300004B to 691356300016B]

## 691356300004B
designator J?
WR-TBL Terminal block - serie 356 - 3.81 mm; Manufacturer: Würth Elektronik eiSos GmbH; ComponentLink1 Description: Manufacturer; ComponentLink2 Description: Datasheet; NoPins: 04; Created Date: 2 January 2014; partNo: 691356300004B; ComponentLink1URL: http://www.we-online.com; ComponentLink2URL: http://katalog.we-online.de/em/datasheet/6913563000xxB.pdf; Created by: Karrer Zheng
footprint 691356300004B (3,81mm - PCB - Double level - Vertical - 04p)
pins: 1, 2, 3, 4

## 691356300006B
designator J?
WR-TBL Terminal block - serie 356 - 3.81 mm; Manufacturer: Würth Elektronik eiSos GmbH; ComponentLink1 Description: Manufacturer; ComponentLink2 Description: Datasheet; NoPins: 06; Created Date: 2 January 2014; partNo: 691356300006B; ComponentLink1URL: http://www.we-online.com; ComponentLink2URL: http://katalog.we-online.de/em/datasheet/6913563000xxB.pdf; Created by: Karrer Zheng
footprint 691356300006B (3,81mm - PCB - Double level - Vertical - 06p)
pins: 1, 2, 3, 4, 5, 6

## 691356300008B
designator J?
WR-TBL Terminal block - serie 356 - 3.81 mm; Manufacturer: Würth Elektronik eiSos GmbH; ComponentLink1 Description: Manufacturer; ComponentLink2 Description: Datasheet; NoPins: 08; Created Date: 2 January 2014; partNo: 691356300008B; ComponentLink1URL: http://www.we-online.com; ComponentLink2URL: http://katalog.we-online.de/em/datasheet/6913563000xxB.pdf; Created by: Karrer Zheng
footprint 691356300008B (3,81mm - PCB - Double level - Vertical - 08p)
pins: 1, 2, 3, 4, 5, 6, 7, 8

## 691356300010B
designator J?
WR-TBL Terminal block - serie 356 - 3.81 mm; Manufacturer: Würth Elektronik eiSos GmbH; ComponentLink1 Description: Manufacturer; ComponentLink2 Description: Datasheet; NoPins: 10; Created Date: 2 January 2014; partNo: 691356300010B; ComponentLink1URL: http://www.we-online.com; ComponentLink2URL: http://katalog.we-online.de/em/datasheet/6913563000xxB.pdf; Created by: Karrer Zheng
footprint 691356300010B (3,81mm - PCB - Double level - Vertical - 10p)
pins: 1, 2, 3, 4, 5, 6, 7, 8, 9, 10

## 691356300012B
designator J?
WR-TBL Terminal block - serie 356 - 3.81 mm; Manufacturer: Würth Elektronik eiSos GmbH; ComponentLink1 Description: Manufacturer; ComponentLink2 Description: Datasheet; NoPins: 12; Created Date: 2 January 2014; partNo: 691356300012B; ComponentLink1URL: http://www.we-online.com; ComponentLink2URL: http://katalog.we-online.de/em/datasheet/6913563000xxB.pdf; Created by: Karrer Zheng
footprint 691356300012B (3,81mm - PCB - Double level - Vertical - 12p)
pins: 1, 2, 3, 4, 5, 6, 7, 8, 9, 10, 11, 12

## 691356300016B
designator J?
WR-TBL Terminal block - serie 356 - 3.81 mm; Manufacturer: Würth Elektronik eiSos GmbH; ComponentLink1 Description: Manufacturer; ComponentLink2 Description: Datasheet; NoPins: 16; Created Date: 2 January 2014; partNo: 691356300016B; ComponentLink1URL: http://www.we-online.com; ComponentLink2URL: http://katalog.we-online.de/em/datasheet/6913563000xxB.pdf; Created by: Karrer Zheng
footprint 691356300016B (3,81mm - PCB - Double level - Vertical - 16p)
pins: 1, 2, 3, 4, 5, 6, 7, 8, 9, 10, 11, 12, 13, 14, 15, 16


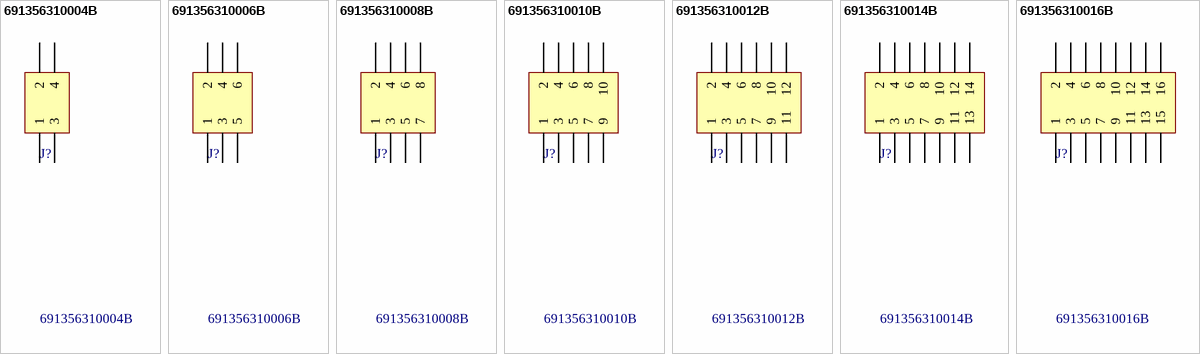
[diagram p13: symbols 691356310004B to 691356310016B]

## 691356310004B
designator J?
WR-TBL Terminal block - serie 356 B - 3.81 mm; Manufacturer: Würth Elektronik eiSos GmbH; ComponentLink1 Description: Manufacturer; ComponentLink2 Description: Datasheet; NoPins: 04; Created Date: 30 December 2013; partNo: 691356310004B; ComponentLink1URL: http://www.we-online.com; ComponentLink2URL: http://katalog.we-online.de/em/datasheet/6913563100xxB.pdf; Created by: Karrer Zheng
footprint 691356310004B (3,81mm - PCB - Double level - Horizontal - with flanges - 04p)
pins: 1, 2, 3, 4

## 691356310006B
designator J?
WR-TBL Terminal block - serie 356 B - 3.81 mm; Manufacturer: Würth Elektronik eiSos GmbH; ComponentLink1 Description: Manufacturer; ComponentLink2 Description: Datasheet; NoPins: 06; Created Date: 30 December 2013; partNo: 691356310006B; ComponentLink1URL: http://www.we-online.com; ComponentLink2URL: http://katalog.we-online.de/em/datasheet/6913563100xxB.pdf; Created by: Karrer Zheng
footprint 691356310006B (3,81mm - PCB - Double level - Horizontal - with flanges - 06p)
pins: 1, 2, 3, 4, 5, 6

## 691356310008B
designator J?
WR-TBL Terminal block - serie 356 B - 3.81 mm; Manufacturer: Würth Elektronik eiSos GmbH; ComponentLink1 Description: Manufacturer; ComponentLink2 Description: Datasheet; NoPins: 08; Created Date: 30 December 2013; partNo: 691356310008B; ComponentLink1URL: http://www.we-online.com; ComponentLink2URL: http://katalog.we-online.de/em/datasheet/6913563100xxB.pdf; Created by: Karrer Zheng
footprint 691356310008B (3,81mm - PCB - Double level - Horizontal - with flanges - 08p)
pins: 1, 2, 3, 4, 5, 6, 7, 8

## 691356310010B
designator J?
WR-TBL Terminal block - serie 356 B - 3.81 mm; Manufacturer: Würth Elektronik eiSos GmbH; ComponentLink1 Description: Manufacturer; ComponentLink2 Description: Datasheet; NoPins: 10; Created Date: 30 December 2013; partNo: 691356310010B; ComponentLink1URL: http://www.we-online.com; ComponentLink2URL: http://katalog.we-online.de/em/datasheet/6913563100xxB.pdf; Created by: Karrer Zheng
footprint 691356310010B (3,81mm - PCB - Double level - Horizontal - with flanges - 10p)
pins: 1, 2, 3, 4, 5, 6, 7, 8, 9, 10

## 691356310012B
designator J?
WR-TBL Terminal block - serie 356 B - 3.81 mm; Manufacturer: Würth Elektronik eiSos GmbH; ComponentLink1 Description: Manufacturer; ComponentLink2 Description: Datasheet; NoPins: 12; Created Date: 30 December 2013; partNo: 691356310012B; ComponentLink1URL: http://www.we-online.com; ComponentLink2URL: http://katalog.we-online.de/em/datasheet/6913563100xxB.pdf; Created by: Karrer Zheng
footprint 691356310012B (3,81mm - PCB - Double level - Horizontal - with flanges - 12p)
pins: 1, 2, 3, 4, 5, 6, 7, 8, 9, 10, 11, 12

## 691356310014B
designator J?
WR-TBL Terminal block - serie 356 B - 3.81 mm; Manufacturer: Würth Elektronik eiSos GmbH; ComponentLink1 Description: Manufacturer; ComponentLink2 Description: Datasheet; NoPins: 14; Created Date: 30 December 2013; partNo: 691356310014B; ComponentLink1URL: http://www.we-online.com; ComponentLink2URL: http://katalog.we-online.de/em/datasheet/6913563100xxB.pdf; Created by: Karrer Zheng
footprint 691356310014B (3,81mm - PCB - Double level - Horizontal - with flanges - 14p)
pins: 1, 2, 3, 4, 5, 6, 7, 8, 9, 10, 11, 12, 13, 14

## 691356310016B
designator J?
WR-TBL Terminal block - serie 356 B - 3.81 mm; Manufacturer: Würth Elektronik eiSos GmbH; ComponentLink1 Description: Manufacturer; ComponentLink2 Description: Datasheet; NoPins: 16; Created Date: 30 December 2013; partNo: 691356310016B; ComponentLink1URL: http://www.we-online.com; ComponentLink2URL: http://katalog.we-online.de/em/datasheet/6913563100xxB.pdf; Created by: Karrer Zheng
footprint 691356310016B (3,81mm - PCB - Double level - Horizontal - with flanges - 16p)
pins: 1, 2, 3, 4, 5, 6, 7, 8, 9, 10, 11, 12, 13, 14, 15, 16


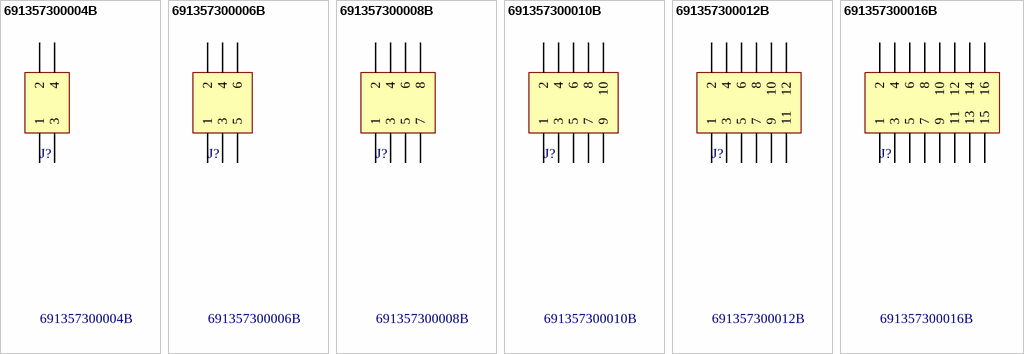
[diagram p14: symbols 691357300004B to 691357300016B]

## 691357300004B
designator J?
WR-TBL Terminal block - serie 357 B - 3.81 mm; Manufacturer: Würth Elektronik eiSos GmbH; ComponentLink1 Description: Manufacturer; ComponentLink2 Description: Datasheet; NoPins: 04; Created Date: 6 January 2014; partNo: 691357300004B; ComponentLink1URL: http://www.we-online.com; ComponentLink2URL: http://katalog.we-online.de/em/datasheet/6913573000xxB.pdf; Created by: Karrer Zheng
footprint 691357300004B (3,81mm - PCB - Double level - Vertical - with flanges - 04p)
pins: 1, 2, 3, 4

## 691357300006B
designator J?
WR-TBL Terminal block - serie 357 B - 3.81 mm; Manufacturer: Würth Elektronik eiSos GmbH; ComponentLink1 Description: Manufacturer; ComponentLink2 Description: Datasheet; NoPins: 06; Created Date: 6 January 2014; partNo: 691357300006B; ComponentLink1URL: http://www.we-online.com; ComponentLink2URL: http://katalog.we-online.de/em/datasheet/6913573000xxB.pdf; Created by: Karrer Zheng
footprint 691357300006B (3,81mm - PCB - Double level - Vertical - with flanges - 06p)
pins: 1, 2, 3, 4, 5, 6

## 691357300008B
designator J?
WR-TBL Terminal block - serie 357 B - 3.81 mm; Manufacturer: Würth Elektronik eiSos GmbH; ComponentLink1 Description: Manufacturer; ComponentLink2 Description: Datasheet; NoPins: 08; Created Date: 6 January 2014; partNo: 691357300008B; ComponentLink1URL: http://www.we-online.com; ComponentLink2URL: http://katalog.we-online.de/em/datasheet/6913573000xxB.pdf; Created by: Karrer Zheng
footprint 691357300008B (3,81mm - PCB - Double level - Vertical - with flanges - 08p)
pins: 1, 2, 3, 4, 5, 6, 7, 8